# Altium schematic symbol library LATTICEPLDS_Library.SchLib: 291 symbols (part 9 of 32) (continued)
## LFE2M-20/35-F256 (continued)
part D pins: A4 URC_SQ_HDINP3 (in), A5 URC_SQ_HDINP2 (in), A6 URC_SQ_VCCOB3 (power), A7 URC_SQ_HDOUTP3 (out), A8 URC_SQ_HDOUTP2 (out), A10 URC_SQ_HDOUTP1 (out), A11 URC_SQ_HDOUTP0 (out), A12 URC_SQ_VCCOB0 (power), A13 URC_SQ_HDINP1 (in), A14 URC_SQ_HDINP0 (in), B3 URC_SQ_VCCIB3 (power), B4 URC_SQ_HDINN3 (in), B5 URC_SQ_HDINN2 (in), B7 URC_SQ_HDOUTN3 (out), B8 URC_SQ_HDOUTN2 (out), B9 URC_SQ_VCCAUX33 (power), B10 URC_SQ_HDOUTN1 (out), B11 URC_SQ_HDOUTN0 (out), B13 URC_SQ_HDINN1 (in), B14 URC_SQ_HDINN0 (in), B15 URC_SQ_VCCIB0 (power), C3 URC_SQ_VCCRX3 (power), C4 URC_SQ_VCCRX2 (power), C5 URC_SQ_VCCIB2 (power), C6 URC_SQ_VCCTX3 (power), C7 URC_SQ_VCCTX2 (power), C8 URC_SQ_VCCOB2 (power), C9 URC_SQ_VCCP (power), C10 URC_SQ_VCCOB1 (power), C11 URC_SQ_VCCTX1 (power), C12 URC_SQ_VCCTX0 (power), C13 URC_SQ_VCCIB1 (power), C14 URC_SQ_VCCRX1 (power), C15 URC_SQ_VCCRX0 (power), D8 URC_SQ_REFCLKN (in), D9 URC_SQ_REFCLKP (in), E7 VCCIO0 (power), E10 VCCIO1 (power)
part E pins: A1 GND (power), A3 GND (power), A9 GND (power), A15 GND (power), A16 GND (power), B6 GND (power), B12 GND (power), D4 NC, D5 NC, D6 NC, D7 NC, D10 NC, D11 NC, D12 NC, D13 NC, D14 NC, E2 GND (power), E6 NC, E8 NC, E9 NC, E11 NC, E15 GND (power), F4 XRES (io), F7 NC, F8 NC, F9 NC, F10 NC, G7 VCC (power), G8 VCCAUX (power), G9 VCC (power), G10 VCCPLL (power), H7 VCC (power), H8 GND (power), H9 GND (power), H10 VCCAUX (power), H14 GND (power), J3 GND (power), J7 VCCAUX (power), J8 GND (power), J9 GND (power), J10 VCC (power), K6 TCK (in), K7 VCCJ (in), K8 VCC (power), K9 VCCAUX (power), K10 VCC (power), L5 TDI (in), L10 CFG1 (in), L11 CFG2 (in), M2 GND (power), M11 INITN (io), M15 GND (power), N4 TMS (in), N6 TDO (out), N11 CCLK (in), N12 PROGRAMN (in), N13 DONE (io), P9 GND (power), P13 CFG0 (in), R5 GND (power), R12 GND (power), T1 GND (power), T16 GND (power)
part A text: BANK 7; (1 of 5); BANK 6; ** Dedicated input pins can be used for / GPLLs or GDLLs within the respective quadrant.; Pad Name = PL{20/35}
part B text: BANK 5; (2 of 5); BANK 4; Pad Name = PB{20/35}
part C text: BANK 8/3; (3 of 5); BANK 2; ** Dedicated input pins can be used for / GPLLs or GDLLs within the respective quadrant.; Pad Name = PR{20/35}
part D text: BANK 1; (4 of 5); BANK 0; Dedicated SERDES Signals
part E text: (5 of 5)

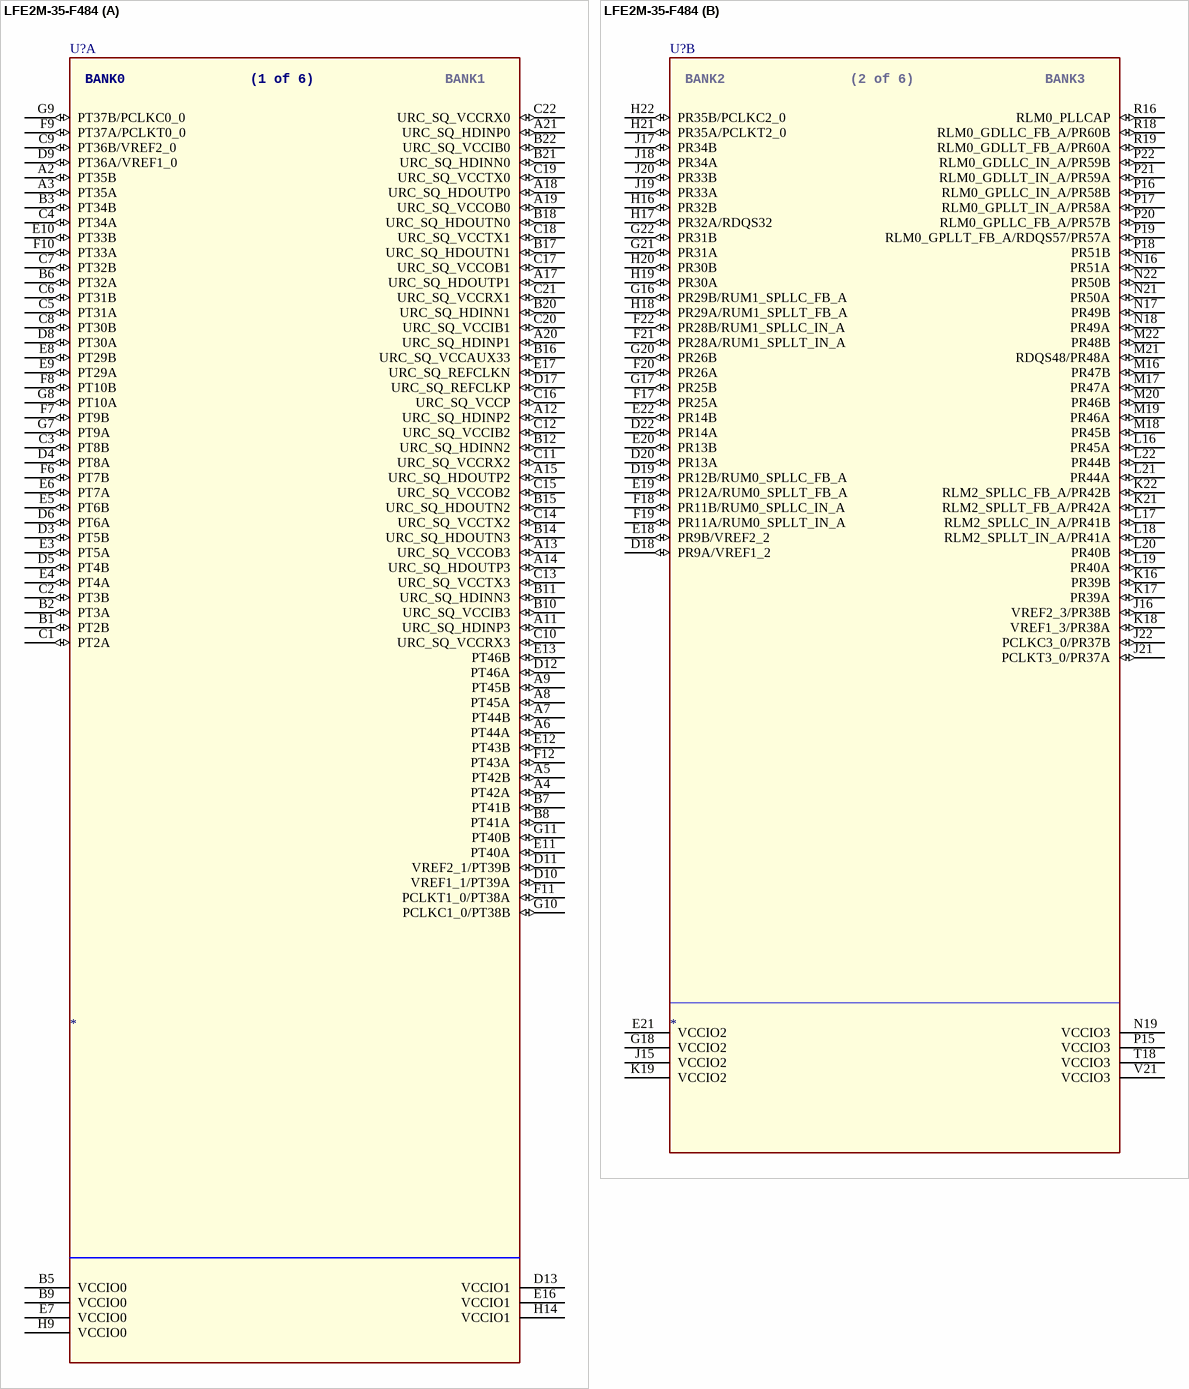
[diagram p97: symbol LFE2M-35-F484]

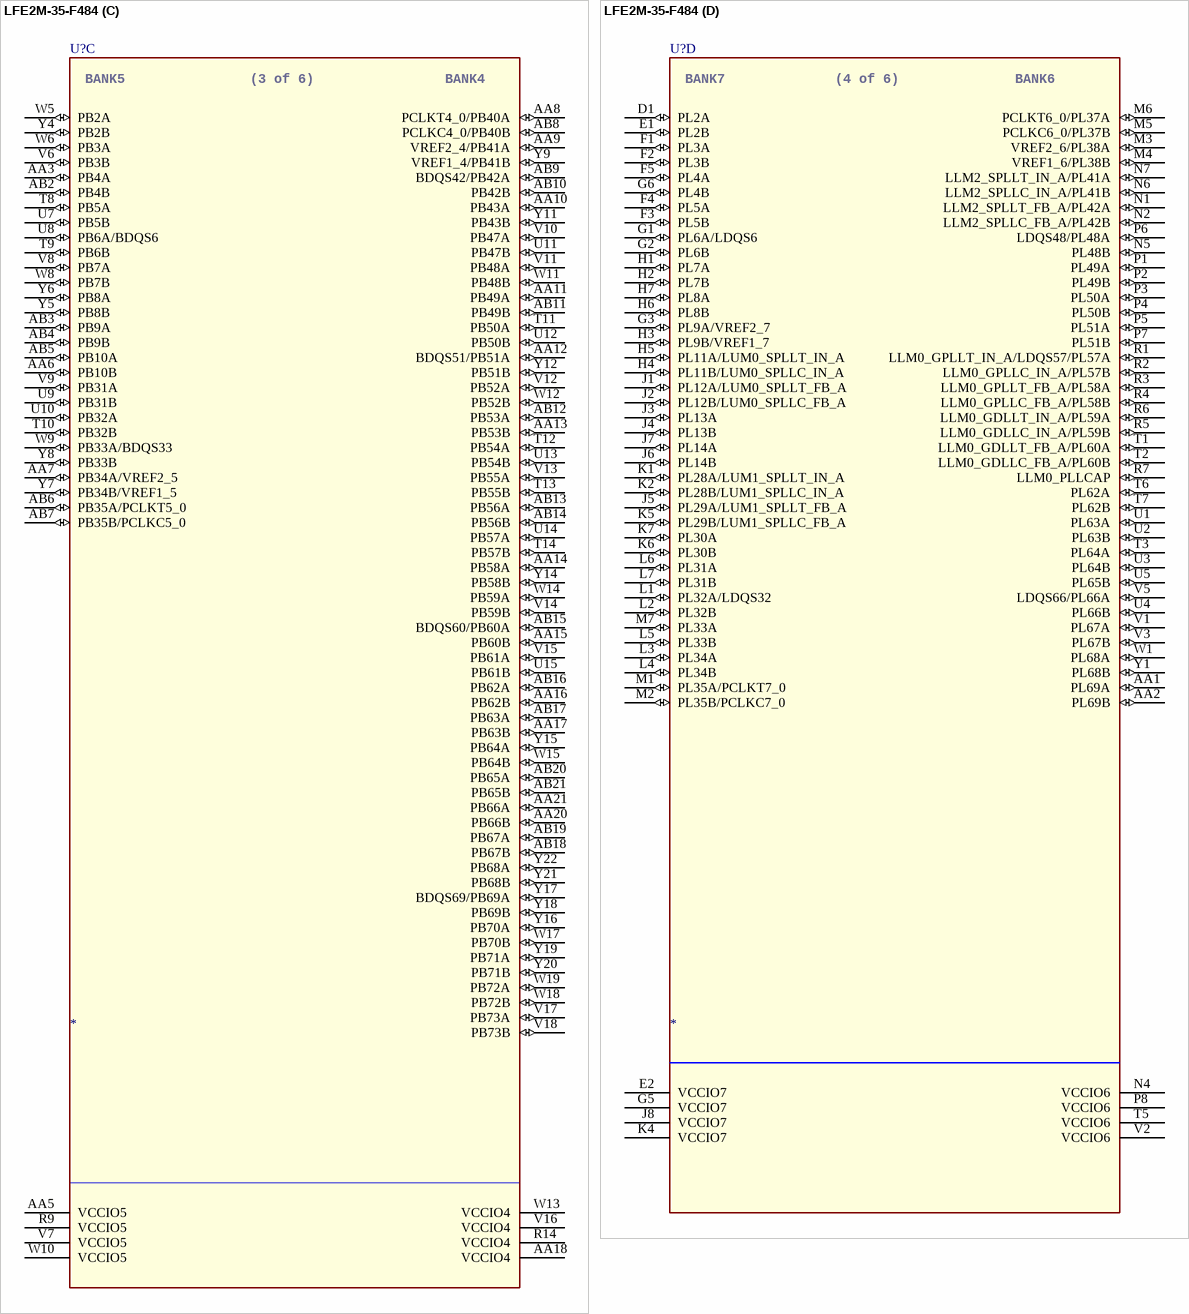
[diagram p98: symbol LFE2M-35-F484]

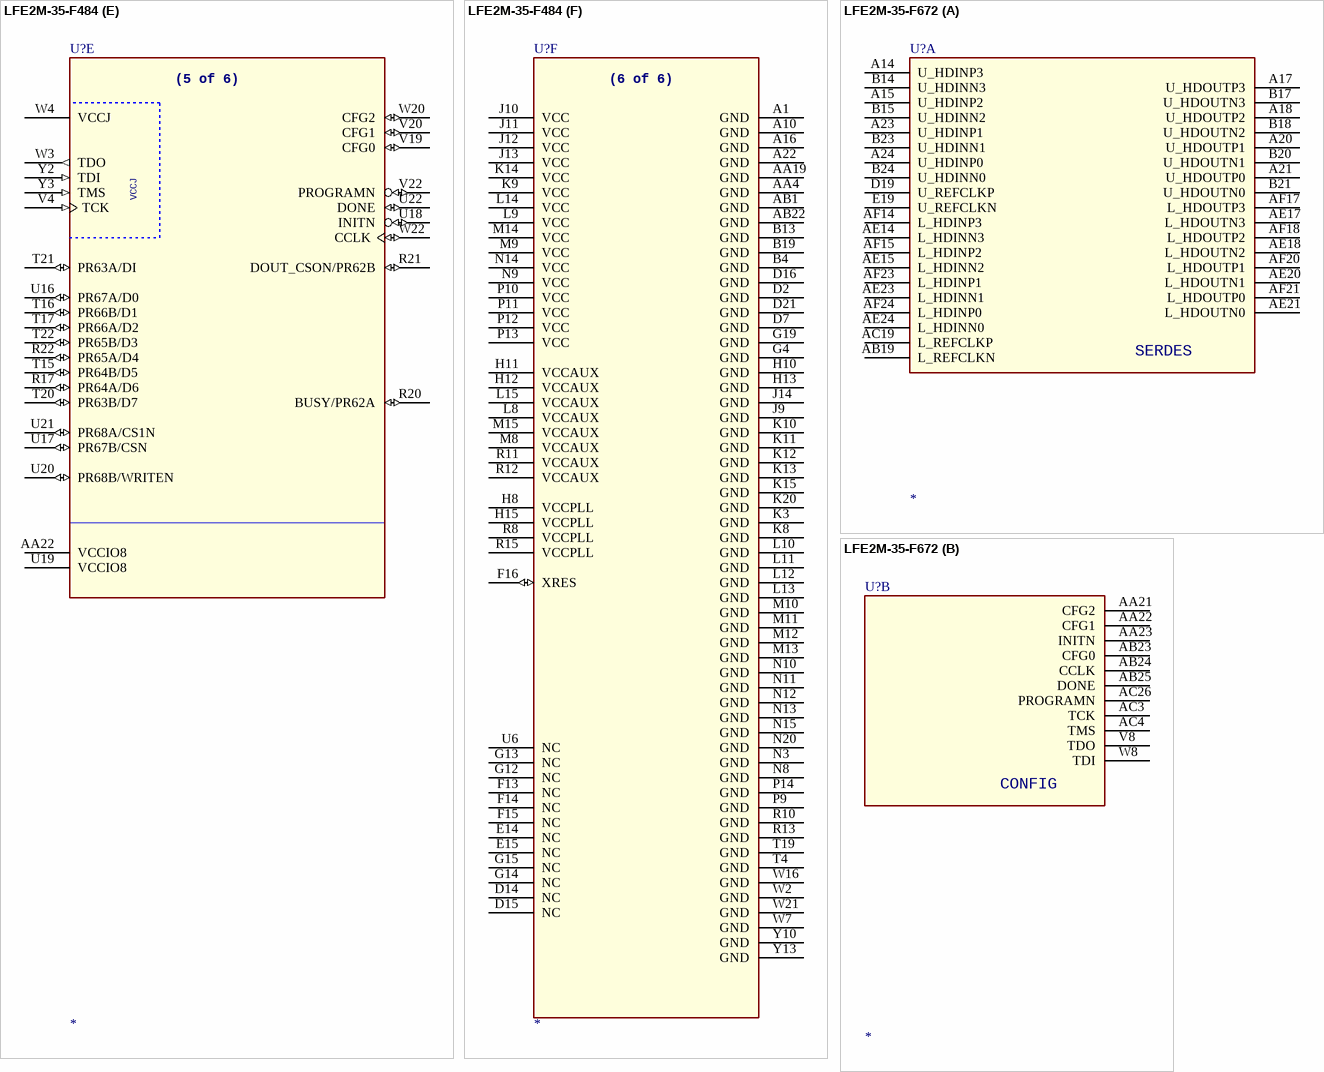
[diagram p99: symbols LFE2M-35-F484 to LFE2M-35-F672]

## LFE2M-35-F484
designator U?
SWAP_INFO: (S1+S2+S3+S4+S5+S6); SPLIT_INST: TRUE
part A pins: A2 PT35B (io), A3 PT35A (io), A4 PT42A (io), A5 PT42B (io), A6 PT44A (io), A7 PT44B (io), A8 PT45A (io), A9 PT45B (io), A11 URC_SQ_HDINP3 (io), A12 URC_SQ_HDINP2 (io), A13 URC_SQ_VCCOB3 (io), A14 URC_SQ_HDOUTP3 (io), A15 URC_SQ_HDOUTP2 (io), A17 URC_SQ_HDOUTP1 (io), A18 URC_SQ_HDOUTP0 (io), A19 URC_SQ_VCCOB0 (io), A20 URC_SQ_HDINP1 (io), A21 URC_SQ_HDINP0 (io), B1 PT2B (io), B2 PT3A (io), B3 PT34B (io), B5 VCCIO0 (power), B6 PT32A (io), B7 PT41B (io), B8 PT41A (io), B9 VCCIO0 (power), B10 URC_SQ_VCCIB3 (io), B11 URC_SQ_HDINN3 (io), B12 URC_SQ_HDINN2 (io), B14 URC_SQ_HDOUTN3 (io), B15 URC_SQ_HDOUTN2 (io), B16 URC_SQ_VCCAUX33 (io), B17 URC_SQ_HDOUTN1 (io), B18 URC_SQ_HDOUTN0 (io), B20 URC_SQ_HDINN1 (io), B21 URC_SQ_HDINN0 (io), B22 URC_SQ_VCCIB0 (io), C1 PT2A (io), C2 PT3B (io), C3 PT8B (io), C4 PT34A (io), C5 PT31A (io), C6 PT31B (io), C7 PT32B (io), C8 PT30B (io), C9 PT36B/VREF2_0 (io), C10 URC_SQ_VCCRX3 (io), C11 URC_SQ_VCCRX2 (io), C12 URC_SQ_VCCIB2 (io), C13 URC_SQ_VCCTX3 (io), C14 URC_SQ_VCCTX2 (io), C15 URC_SQ_VCCOB2 (io), C16 URC_SQ_VCCP (io), C17 URC_SQ_VCCOB1 (io), C18 URC_SQ_VCCTX1 (io), C19 URC_SQ_VCCTX0 (io), C20 URC_SQ_VCCIB1 (io), C21 URC_SQ_VCCRX1 (io), C22 URC_SQ_VCCRX0 (io), D3 PT5B (io), D4 PT8A (io), D5 PT4B (io), D6 PT6A (io), D8 PT30A (io), D9 PT36A/VREF1_0 (io), D10 VREF1_1/PT39A (io), D11 VREF2_1/PT39B (io), D12 PT46A (io), D13 VCCIO1 (power), D17 URC_SQ_REFCLKP (io), E3 PT5A (io), E4 PT4A (io), E5 PT6B (io), E6 PT7A (io), E7 VCCIO0 (power), E8 PT29B (io), E9 PT29A (io), E10 PT33B (io), E11 PT40A (io), E12 PT43B (io), E13 PT46B (io), E16 VCCIO1 (power), E17 URC_SQ_REFCLKN (io), F6 PT7B (io), F7 PT9B (io), F8 PT10B (io), F9 PT37A/PCLKT0_0 (io), F10 PT33A (io), F11 PCLKT1_0/PT38A (io), F12 PT43A (io), G7 PT9A (io), G8 PT10A (io), G9 PT37B/PCLKC0_0 (io), G10 PCLKC1_0/PT38B (io), G11 PT40B (io), H9 VCCIO0 (power), H14 VCCIO1 (power)
part B pins: D18 PR9A/VREF1_2 (io), D19 PR12B/RUM0_SPLLC_FB_A (io), D20 PR13A (io), D22 PR14A (io), E18 PR9B/VREF2_2 (io), E19 PR12A/RUM0_SPLLT_FB_A (io), E20 PR13B (io), E21 VCCIO2 (power), E22 PR14B (io), F17 PR25A (io), F18 PR11B/RUM0_SPLLC_IN_A (io), F19 PR11A/RUM0_SPLLT_IN_A (io), F20 PR26A (io), F21 PR28A/RUM1_SPLLT_IN_A (io), F22 PR28B/RUM1_SPLLC_IN_A (io), G16 PR29B/RUM1_SPLLC_FB_A (io), G17 PR25B (io), G18 VCCIO2 (power), G20 PR26B (io), G21 PR31A (io), G22 PR31B (io), H16 PR32B (io), H17 PR32A/RDQS32 (io), H18 PR29A/RUM1_SPLLT_FB_A (io), H19 PR30A (io), H20 PR30B (io), H21 PR35A/PCLKT2_0 (io), H22 PR35B/PCLKC2_0 (io), J15 VCCIO2 (power), J16 VREF2_3/PR38B (io), J17 PR34B (io), J18 PR34A (io), J19 PR33A (io), J20 PR33B (io), J21 PCLKT3_0/PR37A (io), J22 PCLKC3_0/PR37B (io), K16 PR39B (io), K17 PR39A (io), K18 VREF1_3/PR38A (io), K19 VCCIO2 (power), K21 RLM2_SPLLT_FB_A/PR42A (io), K22 RLM2_SPLLC_FB_A/PR42B (io), L16 PR45A (io), L17 RLM2_SPLLC_IN_A/PR41B (io), L18 RLM2_SPLLT_IN_A/PR41A (io), L19 PR40A (io), L20 PR40B (io), L21 PR44A (io), L22 PR44B (io), M16 PR47B (io), M17 PR47A (io), M18 PR45B (io), M19 PR46A (io), M20 PR46B (io), M21 RDQS48/PR48A (io), M22 PR48B (io), N16 PR51A (io), N17 PR49B (io), N18 PR49A (io), N19 VCCIO3 (power), N21 PR50A (io), N22 PR50B (io), P15 VCCIO3 (power), P16 RLM0_GPLLC_IN_A/PR58B (io), P17 RLM0_GPLLT_IN_A/PR58A (io), P18 PR51B (io), P19 RLM0_GPLLT_FB_A/RDQS57/PR57A (io), P20 RLM0_GPLLC_FB_A/PR57B (io), P21 RLM0_GDLLT_IN_A/PR59A (io), P22 RLM0_GDLLC_IN_A/PR59B (io), R16 RLM0_PLLCAP (io), R18 RLM0_GDLLC_FB_A/PR60B (io), R19 RLM0_GDLLT_FB_A/PR60A (io), T18 VCCIO3 (power), V21 VCCIO3 (power)
part C pins: AA3 PB4A (io), AA5 VCCIO5 (power), AA6 PB10B (io), AA7 PB34A/VREF2_5 (io), AA8 PCLKT4_0/PB40A (io), AA9 VREF2_4/PB41A (io), AA10 PB43A (io), AA11 PB49A (io), AA12 BDQS51/PB51A (io), AA13 PB53B (io), AA14 PB58A (io), AA15 PB60B (io), AA16 PB62B (io), AA17 PB63B (io), AA18 VCCIO4 (power), AA20 PB66B (io), AA21 PB66A (io), AB2 PB4B (io), AB3 PB9A (io), AB4 PB9B (io), AB5 PB10A (io), AB6 PB35A/PCLKT5_0 (io), AB7 PB35B/PCLKC5_0 (io), AB8 PCLKC4_0/PB40B (io), AB9 BDQS42/PB42A (io), AB10 PB42B (io), AB11 PB49B (io), AB12 PB53A (io), AB13 PB56A (io), AB14 PB56B (io), AB15 BDQS60/PB60A (io), AB16 PB62A (io), AB17 PB63A (io), AB18 PB67B (io), AB19 PB67A (io), AB20 PB65A (io), AB21 PB65B (io), R9 VCCIO5 (power), R14 VCCIO4 (power), T8 PB5A (io), T9 PB6B (io), T10 PB32B (io), T11 PB50A (io), T12 PB54A (io), T13 PB55B (io), T14 PB57B (io), U7 PB5B (io), U8 PB6A/BDQS6 (io), U9 PB31B (io), U10 PB32A (io), U11 PB47B (io), U12 PB50B (io), U13 PB54B (io), U14 PB57A (io), U15 PB61B (io), V6 PB3B (io), V7 VCCIO5 (power), V8 PB7A (io), V9 PB31A (io), V10 PB47A (io), V11 PB48A (io), V12 PB52A (io), V13 PB55A (io), V14 PB59B (io), V15 PB61A (io), V16 VCCIO4 (power), V17 PB73A (io), V18 PB73B (io), W5 PB2A (io), W6 PB3A (io), W8 PB7B (io), W9 PB33A/BDQS33 (io), W10 VCCIO5 (power), W11 PB48B (io), W12 PB52B (io), W13 VCCIO4 (power), W14 PB59A (io), W15 PB64B (io), W17 PB70B (io), W18 PB72B (io), W19 PB72A (io), Y4 PB2B (io), Y5 PB8B (io), Y6 PB8A (io), Y7 PB34B/VREF1_5 (io), Y8 PB33B (io), Y9 VREF1_4/PB41B (io), Y11 PB43B (io), Y12 PB51B (io), Y14 PB58B (io), Y15 PB64A (io), Y16 PB70A (io), Y17 BDQS69/PB69A (io), Y18 PB69B (io), Y19 PB71A (io), Y20 PB71B (io), Y21 PB68B (io), Y22 PB68A (io)
part D pins: AA1 PL69A (io), AA2 PL69B (io), D1 PL2A (io), E1 PL2B (io), E2 VCCIO7 (power), F1 PL3A (io), F2 PL3B (io), F3 PL5B (io), F4 PL5A (io), F5 PL4A (io), G1 PL6A/LDQS6 (io), G2 PL6B (io), G3 PL9A/VREF2_7 (io), G5 VCCIO7 (power), G6 PL4B (io), H1 PL7A (io), H2 PL7B (io), H3 PL9B/VREF1_7 (io), H4 PL11B/LUM0_SPLLC_IN_A (io), H5 PL11A/LUM0_SPLLT_IN_A (io), H6 PL8B (io), H7 PL8A (io), J1 PL12A/LUM0_SPLLT_FB_A (io), J2 PL12B/LUM0_SPLLC_FB_A (io), J3 PL13A (io), J4 PL13B (io), J5 PL29A/LUM1_SPLLT_FB_A (io), J6 PL14B (io), J7 PL14A (io), J8 VCCIO7 (power), K1 PL28A/LUM1_SPLLT_IN_A (io), K2 PL28B/LUM1_SPLLC_IN_A (io), K4 VCCIO7 (power), K5 PL29B/LUM1_SPLLC_FB_A (io), K6 PL30B (io), K7 PL30A (io), L1 PL32A/LDQS32 (io), L2 PL32B (io), L3 PL34A (io), L4 PL34B (io), L5 PL33B (io), L6 PL31A (io), L7 PL31B (io), M1 PL35A/PCLKT7_0 (io), M2 PL35B/PCLKC7_0 (io), M3 VREF2_6/PL38A (io), M4 VREF1_6/PL38B (io), M5 PCLKC6_0/PL37B (io), M6 PCLKT6_0/PL37A (io), M7 PL33A (io), N1 LLM2_SPLLT_FB_A/PL42A (io), N2 LLM2_SPLLC_FB_A/PL42B (io), N4 VCCIO6 (power), N5 PL48B (io), N6 LLM2_SPLLC_IN_A/PL41B (io), N7 LLM2_SPLLT_IN_A/PL41A (io), P1 PL49A (io), P2 PL49B (io), P3 PL50A (io), P4 PL50B (io), P5 PL51A (io), P6 LDQS48/PL48A (io), P7 PL51B (io), P8 VCCIO6 (power), R1 LLM0_GPLLT_IN_A/LDQS57/PL57A (io), R2 LLM0_GPLLC_IN_A/PL57B (io), R3 LLM0_GPLLT_FB_A/PL58A (io), R4 LLM0_GPLLC_FB_A/PL58B (io), R5 LLM0_GDLLC_IN_A/PL59B (io), R6 LLM0_GDLLT_IN_A/PL59A (io), R7 LLM0_PLLCAP (io), T1 LLM0_GDLLT_FB_A/PL60A (io), T2 LLM0_GDLLC_FB_A/PL60B (io), T3 PL64A (io), T5 VCCIO6 (power), T6 PL62A (io), T7 PL62B (io), U1 PL63A (io), U2 PL63B (io), U3 PL64B (io), U4 PL66B (io), U5 PL65B (io), V1 PL67A (io), V2 VCCIO6 (power), V3 PL67B (io), V5 LDQS66/PL66A (io), W1 PL68A (io), Y1 PL68B (io)
part E pins: AA22 VCCIO8 (power), R17 PR64A/D6 (io), R20 BUSY/PR62A (io), R21 DOUT_CSON/PR62B (io), R22 PR65A/D4 (io), T15 PR64B/D5 (io), T16 PR66B/D1 (io), T17 PR66A/D2 (io), T20 PR63B/D7 (io), T21 PR63A/DI (io), T22 PR65B/D3 (io), U16 PR67A/D0 (io), U17 PR67B/CSN (io), U18 INITN (io), U19 VCCIO8 (power), U20 PR68B/WRITEN (io), U21 PR68A/CS1N (io), U22 DONE (io), V4 TCK (in), V19 CFG0 (io), V20 CFG1 (io), V22 PROGRAMN (io), W3 TDO (out), W4 VCCJ (power), W20 CFG2 (io), W22 CCLK (io), Y2 TDI (in), Y3 TMS (in)
part F pins: A1 GND (power), A10 GND (power), A16 GND (power), A22 GND (power), AA4 GND (power), AA19 GND (power), AB1 GND (power), AB22 GND (power), B4 GND (power), B13 GND (power), B19 GND (power), D2 GND (power), D7 GND (power), D14 NC, D15 NC, D16 GND (power), D21 GND (power), E14 NC, E15 NC, F13 NC, F14 NC, F15 NC, F16 XRES (io), G4 GND (power), G12 NC, G13 NC, G14 NC, G15 NC, G19 GND (power), H8 VCCPLL (power), H10 GND (power), H11 VCCAUX (power), H12 VCCAUX (power), H13 GND (power), H15 VCCPLL (power), J9 GND (power), J10 VCC (power), J11 VCC (power), J12 VCC (power), J13 VCC (power), J14 GND (power), K3 GND (power), K8 GND (power), K9 VCC (power), K10 GND (power), K11 GND (power), K12 GND (power), K13 GND (power), K14 VCC (power), K15 GND (power), K20 GND (power), L8 VCCAUX (power), L9 VCC (power), L10 GND (power), L11 GND (power), L12 GND (power), L13 GND (power), L14 VCC (power), L15 VCCAUX (power), M8 VCCAUX (power), M9 VCC (power), M10 GND (power), M11 GND (power), M12 GND (power), M13 GND (power), M14 VCC (power), M15 VCCAUX (power), N3 GND (power), N8 GND (power), N9 VCC (power), N10 GND (power), N11 GND (power), N12 GND (power), N13 GND (power), N14 VCC (power), N15 GND (power), N20 GND (power), P9 GND (power), P10 VCC (power), P11 VCC (power), P12 VCC (power), P13 VCC (power), P14 GND (power), R8 VCCPLL (power), R10 GND (power), R11 VCCAUX (power), R12 VCCAUX (power), R13 GND (power), R15 VCCPLL (power), T4 GND (power), T19 GND (power), U6 NC, W2 GND (power), W7 GND (power), W16 GND (power), W21 GND (power), Y10 GND (power), Y13 GND (power)
part A text: BANK0; (1 of 6); BANK1
part B text: BANK2; (2 of 6); BANK3
part C text: BANK5; (3 of 6); BANK4
part D text: BANK7; (4 of 6); BANK6
part E text: (5 of 6)
part F text: (6 of 6)

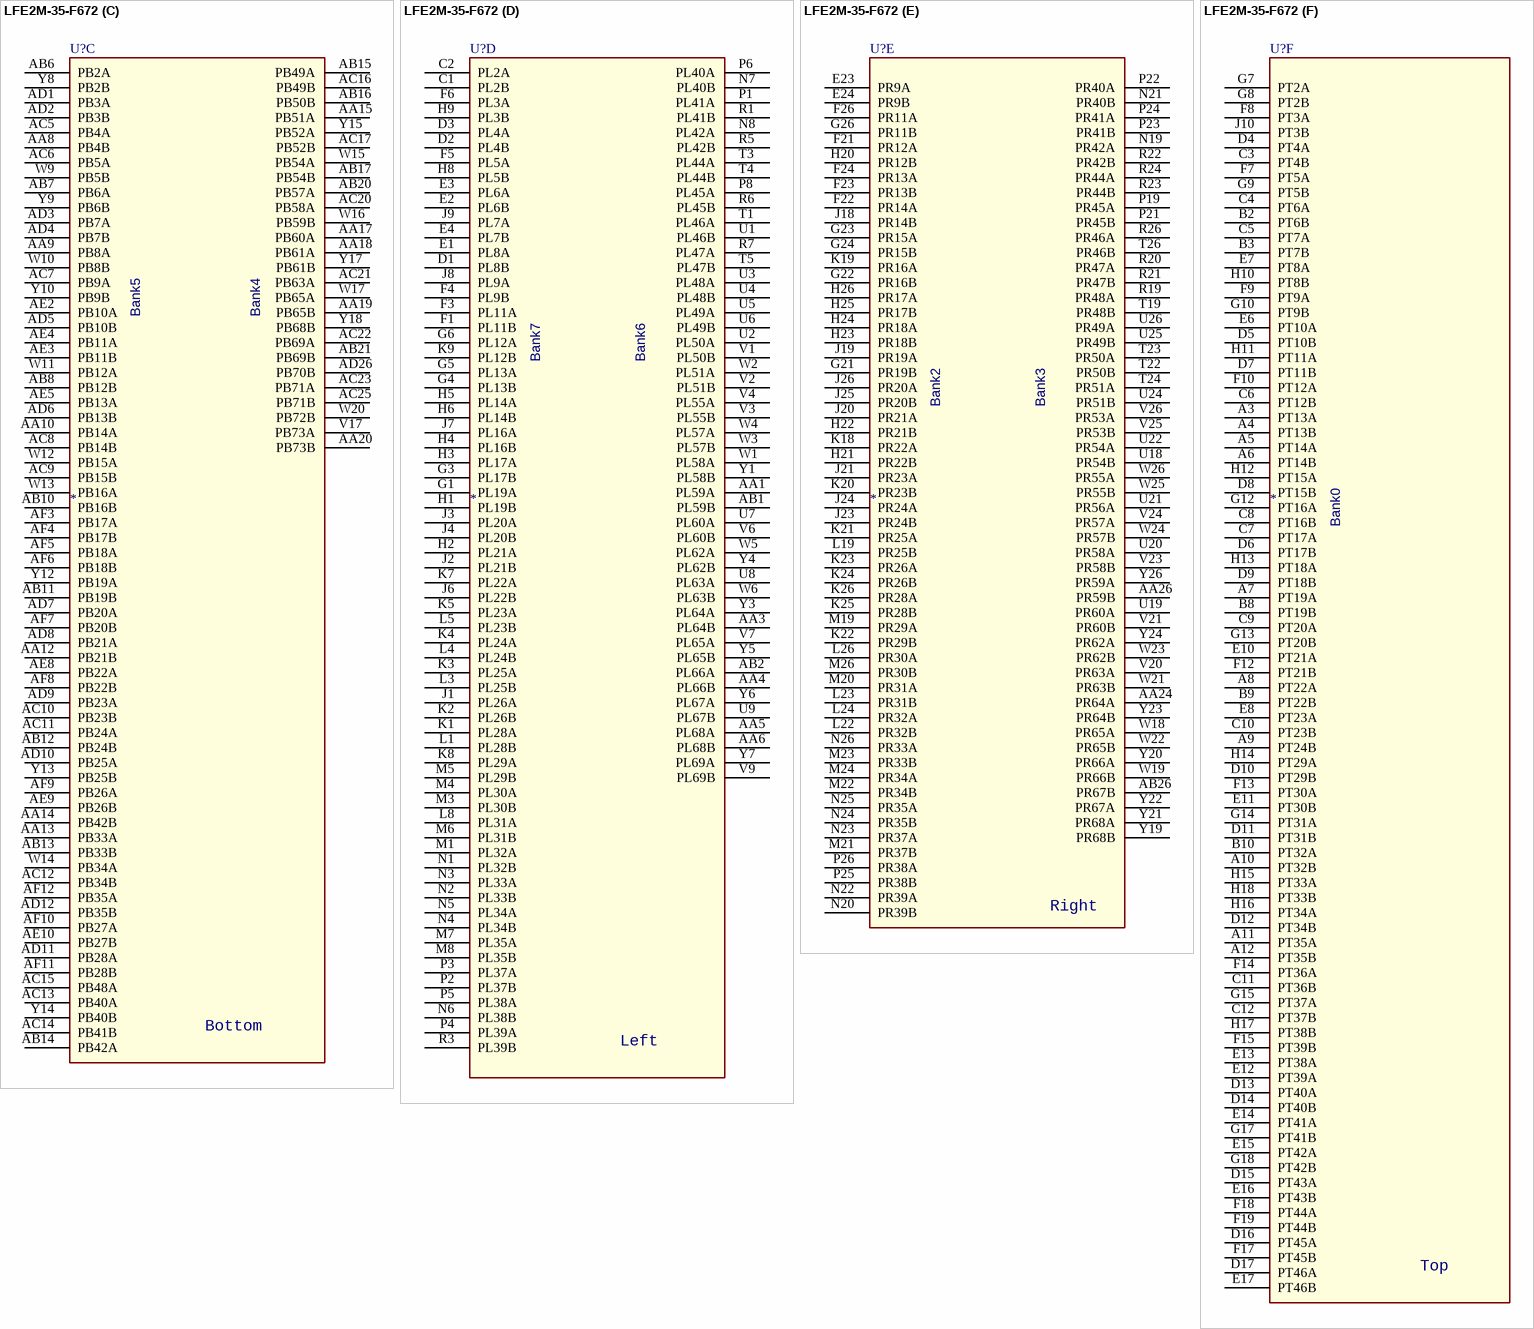
[diagram p100: symbol LFE2M-35-F672]

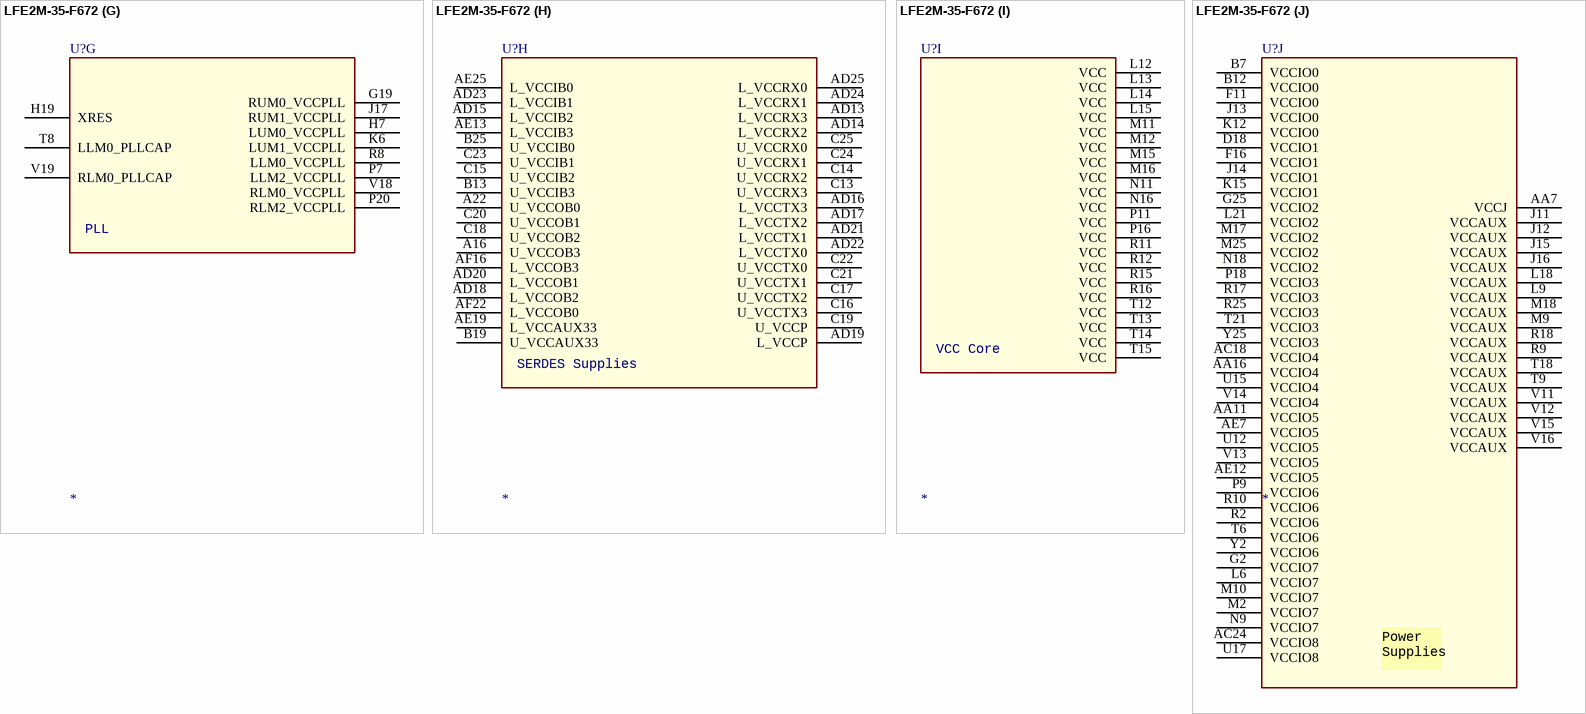
[diagram p101: symbol LFE2M-35-F672]

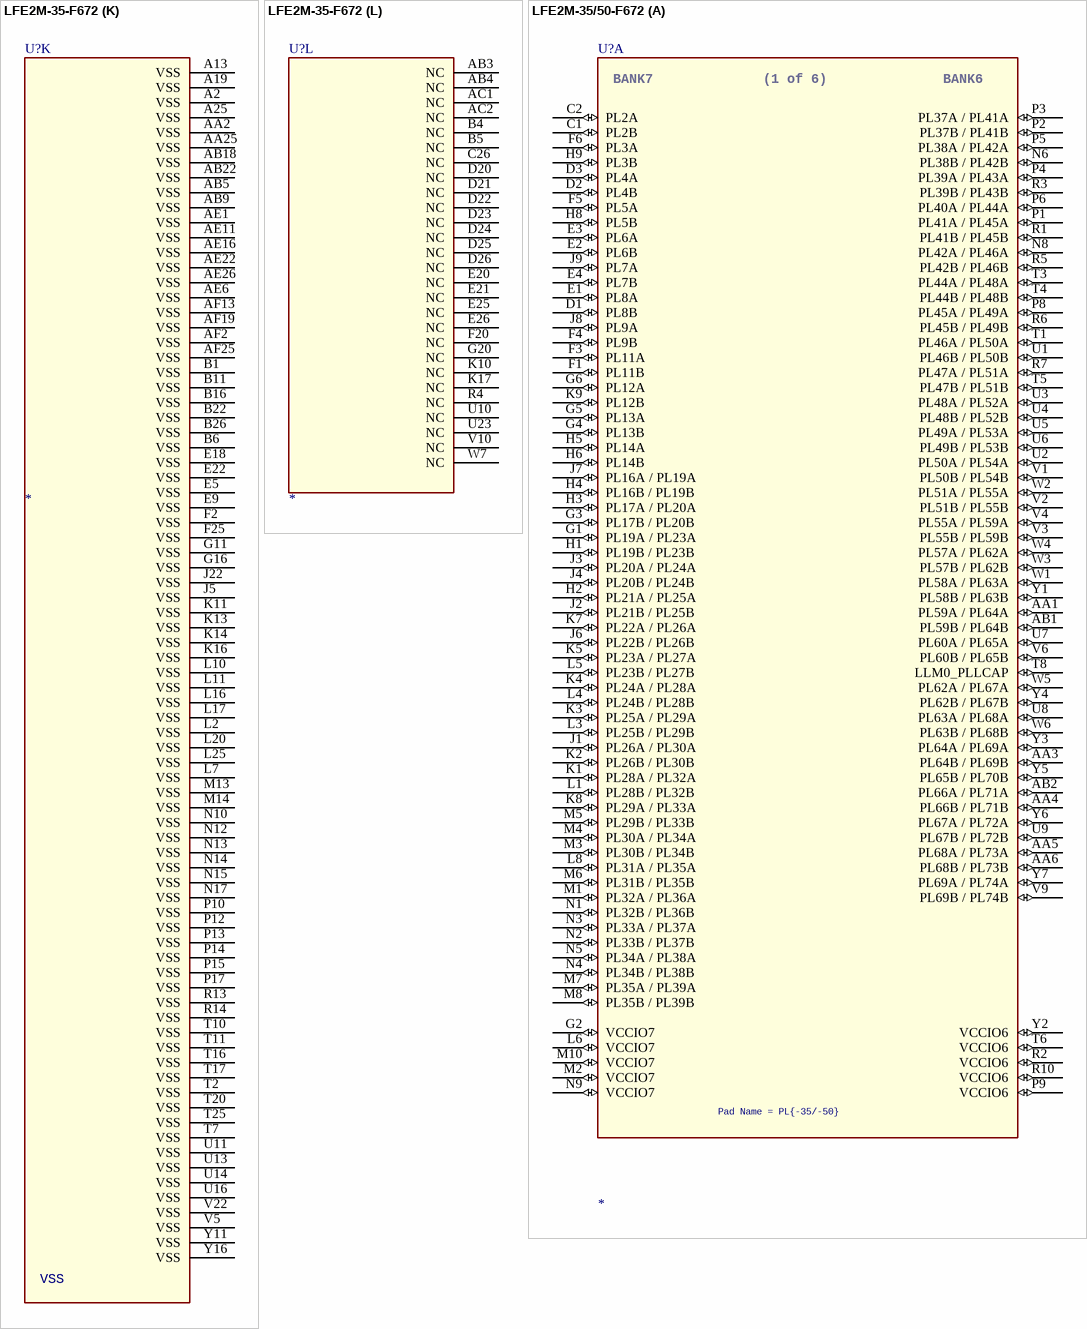
[diagram p102: symbols LFE2M-35-F672 to LFE2M-35/50-F672]